# Altium footprint library Transformers.PcbLib: 102 footprints (part 6 of 7)
Each footprint in its own frame and in the unit in brackets; x right, y up, seen from the top. Pads: shape width x height; smd on the part's side, far side on the other; paste and mask are expansions set on the pad; w line width, h text height; cw(c..) or ccw(c..) is an arc to the next point about the centre after c.
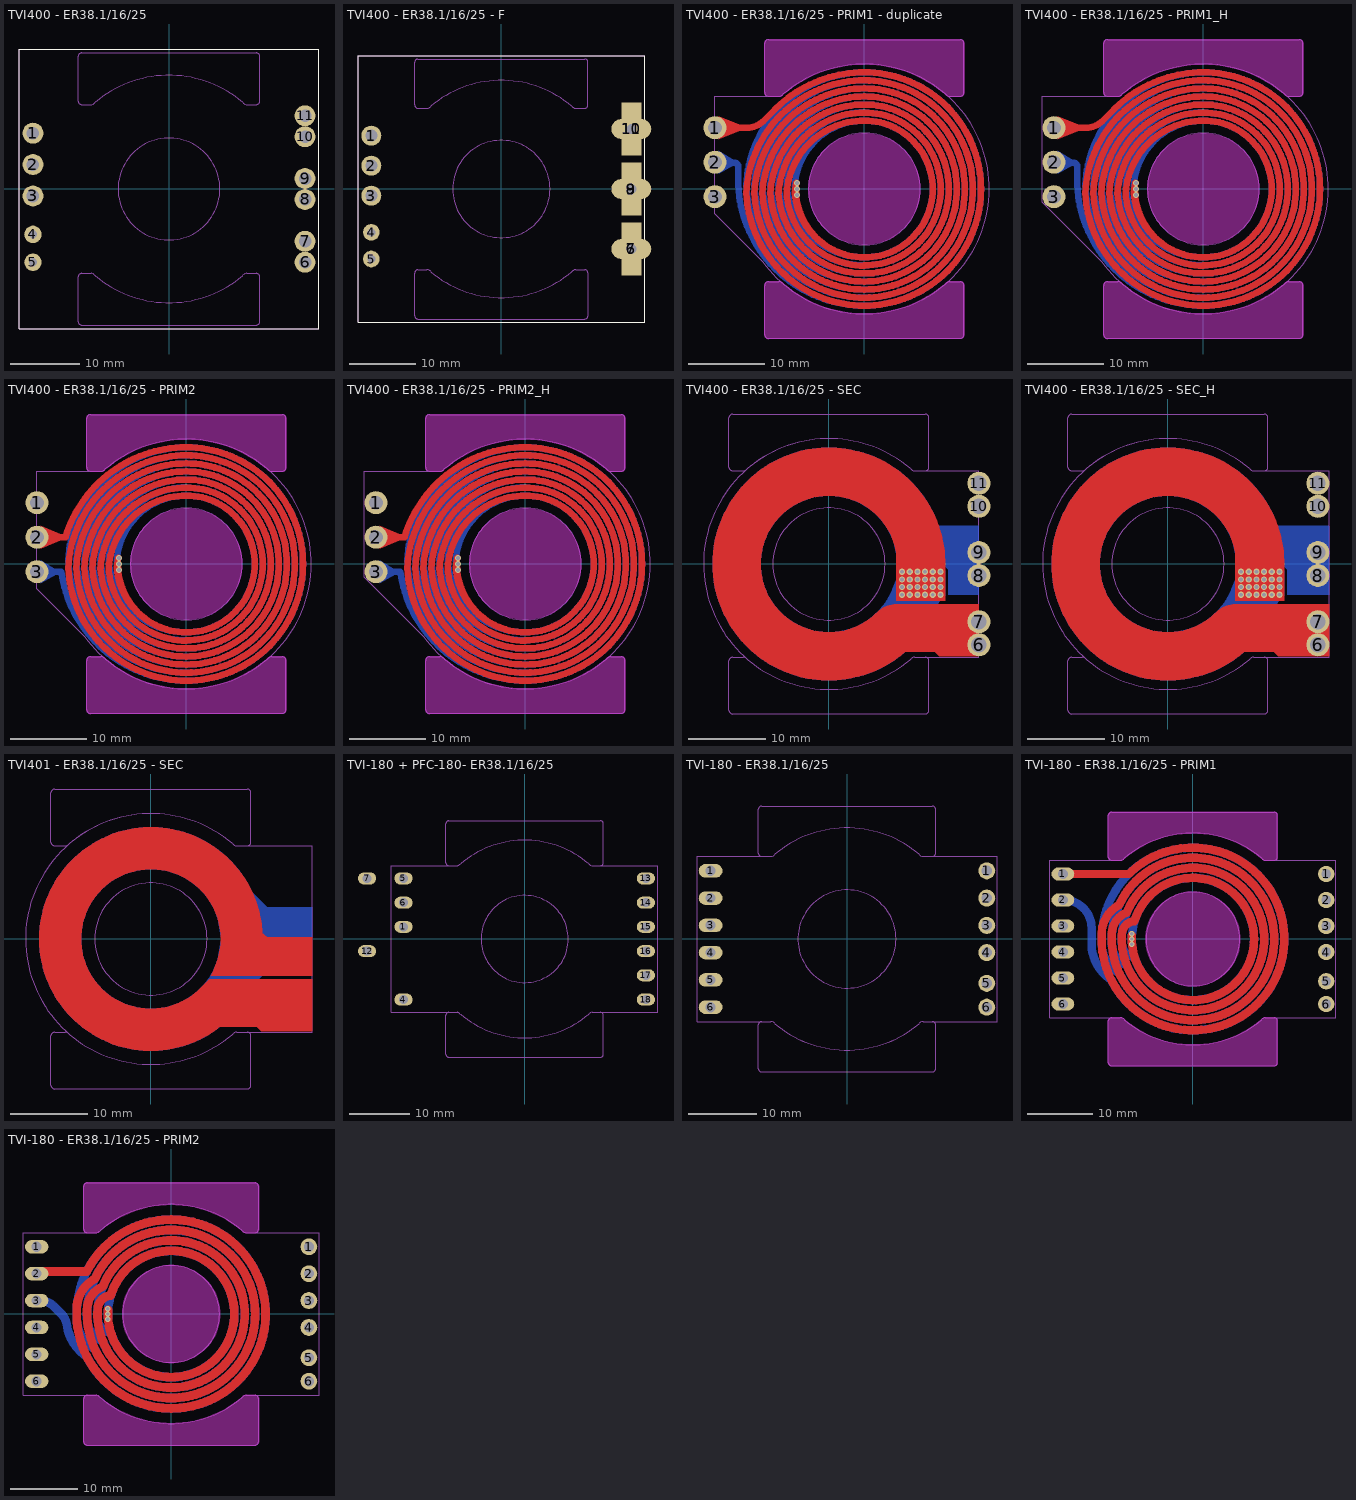
[diagram p5: the footprints below, top view; thin cyan lines are the x and y axes]

## TVI400 - ER38.1/16/25 [mm]
pads (11):
  round 3 hole 1.8: 1(-19.5,8) 2(-19.5,3.5) 3(-19.5,-1) 6(19.5,-10.5) 7(19.5,-7.5) 8(19.5,-1.5) 9(19.5,1.5) 10(19.5,7.5) 11(19.5,10.5)
  round 2.5 hole 1.2: 4(-19.5,-6.5) 5(-19.5,-10.5)
Top Overlay:
  lines w0.15: -21.5,-20 -21.5,20 21.5,20 21.5,-20 -21.5,-20
Top Assembly:
  circle w0.15: c0,0 r7.3
  lines w0.15: -0.251,16.298 cw(c0,0) 10.561,12.416 10.678,12.299 ccw(c11.15,12.771) 11.15,12.103 12.5,12.103 ccw(c12.5,12.603) 13,12.603 13,19 ccw(c12.5,19) 12.5,19.5 -12.5,19.5 ccw(c-12.5,19) -13,19 -13,12.603 ccw(c-12.5,12.603) -12.5,12.103 -11.15,12.103 ccw(c-11.15,12.771) -10.679,12.299 -10.562,12.416 cw(c0,0) 0.251,16.298 ; -13,-19 ccw(c-12.5,-19) -12.5,-19.5 ; -13,-19 ccw(c-12.5,-19) -12.5,-19.5 ; -13,-19 -13,-12.603 ; -13,-19 -13,-12.603 ; -13,-12.603 cw(c-12.5,-12.603) -12.5,-12.103 ; -13,-12.603 cw(c-12.5,-12.603) -12.5,-12.103 ; -12.5,-19.5 12.5,-19.5 ; -12.5,-19.5 12.5,-19.5 ; -12.5,-12.103 -11.15,-12.103 ; -12.5,-12.103 -11.15,-12.103 ; -11.15,-12.103 cw(c-11.15,-12.771) -10.679,-12.299 ; -11.15,-12.103 cw(c-11.15,-12.771) -10.679,-12.299 ; -10.679,-12.299 -10.562,-12.416 ; -10.679,-12.299 -10.562,-12.416 ; -10.561,-12.416 ccw(c0,0) 0.251,-16.298 cw(c0,0) -10.561,-12.416 ; 10.561,-12.416 cw(c0,0) -0.251,-16.298 ccw(c0,0) 10.561,-12.416 ; 10.561,-12.416 10.678,-12.299 ; 10.561,-12.416 10.678,-12.299 ; 10.678,-12.299 cw(c11.15,-12.771) 11.15,-12.103 ; 10.678,-12.299 cw(c11.15,-12.771) 11.15,-12.103 ; 11.15,-12.103 12.5,-12.103 ; 11.15,-12.103 12.5,-12.103 ; 12.5,-19.5 ccw(c12.5,-19) 13,-19 ; 12.5,-19.5 ccw(c12.5,-19) 13,-19 ; 12.5,-12.103 cw(c12.5,-12.603) 13,-12.603 ; 12.5,-12.103 cw(c12.5,-12.603) 13,-12.603 ; 13,-19 13,-12.603 ; 13,-19 13,-12.603 ; -21.5,-20 21.5,-20 21.5,20 -21.5,20 -21.5,-20
3D body "ER38.1-16-25.STEP": height 20, standoff 12, extent -12.7,-19.05 12.7,19.05
3D body "ER38.1-16-25.STEP": height 12, standoff 4, extent -12.7,-19.05 12.7,19.05

## TVI400 - ER38.1/16/25 - F [mm]
pads (11):
  round 3 hole 1.8: 1(-19.5,8) 2(-19.5,3.5) 3(-19.5,-1)
  round 2.5 hole 1.2: 4(-19.5,-6.5) 5(-19.5,-10.5)
  rect 3x8 hole 1.5 square: 6(19.5,-9) 8(19.5,0) 10(19.5,9)
  oval 6x3 all layers, no hole: 7(19.5,-9) 9(19.5,0) 11(19.5,9)
Top Overlay:
  lines w0.15: -21.5,-20 21.5,-20 21.5,20 -21.5,20 -21.5,-20
Top Assembly:
  circle w0.15: c0,0 r7.3
  lines w0.15: -0.251,16.298 cw(c0,0) 10.561,12.416 10.678,12.299 ccw(c11.15,12.771) 11.15,12.103 12.5,12.103 ccw(c12.5,12.603) 13,12.603 13,19 ccw(c12.5,19) 12.5,19.5 -12.5,19.5 ccw(c-12.5,19) -13,19 -13,12.603 ccw(c-12.5,12.603) -12.5,12.103 -11.15,12.103 ccw(c-11.15,12.771) -10.679,12.299 -10.562,12.416 cw(c0,0) 0.251,16.298 ; -13,-19 ccw(c-12.5,-19) -12.5,-19.5 ; -13,-19 ccw(c-12.5,-19) -12.5,-19.5 ; -13,-19 -13,-12.603 ; -13,-19 -13,-12.603 ; -13,-12.603 cw(c-12.5,-12.603) -12.5,-12.103 ; -13,-12.603 cw(c-12.5,-12.603) -12.5,-12.103 ; -12.5,-19.5 12.5,-19.5 ; -12.5,-19.5 12.5,-19.5 ; -12.5,-12.103 -11.15,-12.103 ; -12.5,-12.103 -11.15,-12.103 ; -11.15,-12.103 cw(c-11.15,-12.771) -10.679,-12.299 ; -11.15,-12.103 cw(c-11.15,-12.771) -10.679,-12.299 ; -10.679,-12.299 -10.562,-12.416 ; -10.679,-12.299 -10.562,-12.416 ; -10.561,-12.416 ccw(c0,0) 0.251,-16.298 cw(c0,0) -10.561,-12.416 ; 10.561,-12.416 cw(c0,0) -0.251,-16.298 ccw(c0,0) 10.561,-12.416 ; 10.561,-12.416 10.678,-12.299 ; 10.561,-12.416 10.678,-12.299 ; 10.678,-12.299 cw(c11.15,-12.771) 11.15,-12.103 ; 10.678,-12.299 cw(c11.15,-12.771) 11.15,-12.103 ; 11.15,-12.103 12.5,-12.103 ; 11.15,-12.103 12.5,-12.103 ; 12.5,-19.5 ccw(c12.5,-19) 13,-19 ; 12.5,-19.5 ccw(c12.5,-19) 13,-19 ; 12.5,-12.103 cw(c12.5,-12.603) 13,-12.603 ; 12.5,-12.103 cw(c12.5,-12.603) 13,-12.603 ; 13,-19 13,-12.603 ; 13,-19 13,-12.603 ; -21.5,-20 -21.5,20 21.5,20 21.5,-20 -21.5,-20
3D body "ER38.1-16-25.STEP": height 12, standoff 4, extent -12.7,-19.05 12.7,19.05
3D body "ER38.1-16-25.STEP": height 20, standoff 12, extent -12.7,-19.05 12.7,19.05

## TVI400 - ER38.1/16/25 - PRIM1 - duplicate [mm]
pads (3):
  round 3 hole 1.8: 1(-19.5,8) 2(-19.5,3.5) 3(-19.5,-1)
via -8.8,0.8 diameter 0.8 hole 0.5
via -8.8,-0.8 diameter 0.8 hole 0.5
via -8.8,0 diameter 0.8 hole 0.5
Top Layer:
  region: -19,9.5 -15.25,8 -19,6.5
  lines w0.85: -19,8 -15.307,8 ccw(c-15.307,11.066) -13.139,8.898 -12.019,10.018 cw(c0,-1.25) 0,15.225 ; -10.152,-0.503 ccw(c0,0.175) 0,-10 cw(c0,0.175) -10.153,-0.494 ; -10.148,-0.507 cw(c0,-1.25) 0,8.925 ; -10.147,-0.497 cw(c0,-1.25) 0,8.925 ; -9.085,-0.401 cw(c0,-1.25) -8.892,0.798 ; -9.075,-0.498 ccw(c0,0.175) 0,-8.925 ; -8.911,-0.495 ccw(c0,0) 0,-8.925 ; 0,-15.225 cw(c0,0.2) -15.409,-0.496 ccw(c0,0.2) 0,-15.225 ; 0,-15.225 ccw(c0,0) 15.225,0 ; 0,-15.225 ccw(c0,0) 15.225,0 ; 0,-14.175 cw(c0,0.2) -14.358,-0.505 ccw(c0,0.2) 0,-14.175 ; 0,-14.175 ccw(c0,0) 14.175,0 ; 0,-14.175 ccw(c0,0) 14.175,0 ; 0,-13.125 cw(c0,0.2) -13.306,-0.503 ccw(c0,0.2) 0,-13.125 ; 0,-13.125 ccw(c0,0) 13.125,0 ; 0,-13.125 ccw(c0,0) 13.125,0 ; 0,-12.075 cw(c0,0.2) -12.255,-0.5 ccw(c0,0.2) 0,-12.075 ; 0,-12.075 ccw(c0,0) 12.075,0 ; 0,-12.075 ccw(c0,0) 12.075,0 ; 0,-11.025 cw(c0,0.2) -11.203,-0.497 ccw(c0,0.2) 0,-11.025 ; 0,-11.025 ccw(c0,0) 11.025,0 ; 0,-11.025 ccw(c0,0) 11.025,0 ; 0,-8.925 ccw(c0,0) 8.925,0 ; 0,-8.925 ccw(c0,0) 8.925,0 ; 0,8.925 cw(c0,0) 8.925,0 ; 0,8.925 cw(c0,0) 8.925,0 ; 0,9.975 ccw(c0,-1.25) -11.2,-0.503 cw(c0,-1.25) 0,9.975 ; 0,9.975 cw(c0,0) 9.975,0 ; 0,9.975 cw(c0,0) 9.975,0 ; 0,11.025 ccw(c0,-1.25) -12.252,-0.5 cw(c0,-1.25) 0,11.025 ; 0,11.025 cw(c0,0) 11.025,0 ; 0,11.025 cw(c0,0) 11.025,0 ; 0,12.075 ccw(c0,-1.25) -13.304,-0.497 cw(c0,-1.25) 0,12.075 ; 0,12.075 cw(c0,0) 12.075,0 ; 0,12.075 cw(c0,0) 12.075,0 ; 0,13.125 ccw(c0,-1.25) -14.355,-0.494 cw(c0,-1.25) 0,13.125 ; 0,13.125 cw(c0,0) 13.125,0 ; 0,13.125 cw(c0,0) 13.125,0 ; 0,14.175 ccw(c0,-1.25) -15.407,-0.505 cw(c0,-1.25) 0,14.175 ; 0,14.175 cw(c0,0) 14.175,0 ; 0,14.175 cw(c0,0) 14.175,0 ; 0,15.225 cw(c0,0) 15.225,0 ; 0,15.225 cw(c0,0) 15.225,0 ; 9.975,0 cw(c0,0) 0,-9.975 ccw(c0,0) 9.975,0
Bottom Layer:
  region: -19,5 -16.473,3.441 -19,2
  region: -9.3,0.4
  lines w0.85: -15.409,0.496 cw(c0,-0.2) 0,15.225 cw(c0,0) 15.225,0 cw(c0,0) 0,-15.225 cw(c0,1.25) -16.458,0.505 -16.458,2.899 ccw(c-17,2.899) -17,3.441 -18.941,3.441 ; -15.407,0.505 ccw(c0,1.25) 0,-14.175 ccw(c0,0) 14.175,0 ccw(c0,0) 0,14.175 ccw(c0,-0.2) -14.358,0.505 ; -14.355,0.494 ccw(c0,1.25) 0,-13.125 ccw(c0,0) 13.125,0 ccw(c0,0) 0,13.125 ccw(c0,-0.2) -13.306,0.503 ; -13.304,0.497 ccw(c0,1.25) 0,-12.075 ccw(c0,0) 12.075,0 ccw(c0,0) 0,12.075 ccw(c0,-0.2) -12.255,0.5 ; -12.252,0.5 ccw(c0,1.25) 0,-11.025 ccw(c0,0) 11.025,0 ccw(c0,0) 0,11.025 ccw(c0,-0.2) -11.203,0.497 ; -11.2,0.503 ccw(c0,1.25) 0,-9.975 ccw(c0,0) 9.975,0 ccw(c0,0) 0,9.975 ; -10.152,0.503 cw(c0,-0.175) 0,10 ; -10.147,0.497 ccw(c0,1.25) 0,-8.925 ccw(c0,0) 8.925,0 ccw(c0,0) 0,8.925 ccw(c0,-0.175) -9.075,0.498 ; -9.085,0.401 ccw(c0,1.25) -8.892,-0.798 ; -18.941,3.441 cw(c-18.941,3.5) -19,3.5 ccw(c-18.941,3.5) -18.941,3.441
Keep-Out Layer:
  drawing of 3 lines, arcs and shapes, not listed
Mechanical 2:
  circle w0.15: c0,0 r7.3
  lines w0.15: -19.5,-3 -19.5,-3.238 ; -0.251,-16.298 ccw(c0,0) 10.561,-12.416 ccw(c0,0) -0.251,16.298 ; 0.251,-16.298 cw(c0,0) -13.264,-9.474 -19.5,-3.238 ; 0.251,16.298 ccw(c0,0) -10.562,12.415 -10.679,12.299 cw(c-11.15,12.771) -11.15,12.103 -12.501,12.103 -19.5,12.103 -19.5,-0.5 -19.5,-3.238
Top Assembly:
  circle w0.15: c0,0 r7.3
  lines w0.15: -0.251,16.298 cw(c0,0) 10.561,12.416 10.678,12.299 ccw(c11.15,12.771) 11.15,12.103 12.5,12.103 ccw(c12.5,12.603) 13,12.603 13,19 ccw(c12.5,19) 12.5,19.5 -12.5,19.5 ccw(c-12.5,19) -13,19 -13,12.603 ccw(c-12.5,12.603) -12.5,12.103 -11.15,12.103 ccw(c-11.15,12.771) -10.679,12.299 -10.562,12.416 cw(c0,0) 0.251,16.298 ; -13,-19 ccw(c-12.5,-19) -12.5,-19.5 ; -13,-19 ccw(c-12.5,-19) -12.5,-19.5 ; -13,-19 -13,-12.603 ; -13,-19 -13,-12.603 ; -13,-12.603 cw(c-12.5,-12.603) -12.5,-12.103 ; -13,-12.603 cw(c-12.5,-12.603) -12.5,-12.103 ; -12.5,-19.5 12.5,-19.5 ; -12.5,-19.5 12.5,-19.5 ; -12.5,-12.103 -11.15,-12.103 ; -12.5,-12.103 -11.15,-12.103 ; -11.15,-12.103 cw(c-11.15,-12.771) -10.679,-12.299 ; -11.15,-12.103 cw(c-11.15,-12.771) -10.679,-12.299 ; -10.679,-12.299 -10.562,-12.416 ; -10.679,-12.299 -10.562,-12.416 ; -10.561,-12.416 ccw(c0,0) 0.251,-16.298 cw(c0,0) -10.561,-12.416 ; 10.561,-12.416 cw(c0,0) -0.251,-16.298 ccw(c0,0) 10.561,-12.416 ; 10.561,-12.416 10.678,-12.299 ; 10.561,-12.416 10.678,-12.299 ; 10.678,-12.299 cw(c11.15,-12.771) 11.15,-12.103 ; 10.678,-12.299 cw(c11.15,-12.771) 11.15,-12.103 ; 11.15,-12.103 12.5,-12.103 ; 11.15,-12.103 12.5,-12.103 ; 12.5,-19.5 ccw(c12.5,-19) 13,-19 ; 12.5,-19.5 ccw(c12.5,-19) 13,-19 ; 12.5,-12.103 cw(c12.5,-12.603) 13,-12.603 ; 12.5,-12.103 cw(c12.5,-12.603) 13,-12.603 ; 13,-19 13,-12.603 ; 13,-19 13,-12.603
3D body "ER38.1-16-25.STEP": height 7.5, standoff -0.5, extent -12.7,-19.05 12.7,19.05

## TVI400 - ER38.1/16/25 - PRIM1_H [mm]
pads (3):
  round 3 hole 1.8: 1(-19.5,8) 2(-19.5,3.5) 3(-19.5,-1)
via -8.8,0 diameter 0.8 hole 0.5
via -8.8,-0.8 diameter 0.8 hole 0.5
via -8.8,0.8 diameter 0.8 hole 0.5
Top Layer:
  region: -19,9.5 -15.25,8 -19,6.5
  lines w0.85: -19,8 -15.307,8 ccw(c-15.307,11.066) -13.139,8.898 -12.019,10.018 cw(c0,-1.25) 0,15.225 ; -10.152,-0.503 ccw(c0,0.175) 0,-10 cw(c0,0.175) -10.153,-0.494 ; -10.148,-0.507 cw(c0,-1.25) 0,8.925 ; -10.147,-0.497 cw(c0,-1.25) 0,8.925 ; -9.085,-0.401 cw(c0,-1.25) -8.892,0.798 ; -9.075,-0.498 ccw(c0,0.175) 0,-8.925 ; -8.911,-0.495 ccw(c0,0) 0,-8.925 ; 0,-15.225 ccw(c0,0) 15.225,0 ; 0,-15.225 cw(c0,0.2) -15.409,-0.496 ccw(c0,0.2) 0,-15.225 ; 0,-15.225 ccw(c0,0) 15.225,0 ; 0,-14.175 ccw(c0,0) 14.175,0 ; 0,-14.175 cw(c0,0.2) -14.358,-0.505 ccw(c0,0.2) 0,-14.175 ; 0,-14.175 ccw(c0,0) 14.175,0 ; 0,-13.125 ccw(c0,0) 13.125,0 ; 0,-13.125 cw(c0,0.2) -13.306,-0.503 ccw(c0,0.2) 0,-13.125 ; 0,-13.125 ccw(c0,0) 13.125,0 ; 0,-12.075 ccw(c0,0) 12.075,0 ; 0,-12.075 cw(c0,0.2) -12.255,-0.5 ccw(c0,0.2) 0,-12.075 ; 0,-12.075 ccw(c0,0) 12.075,0 ; 0,-11.025 ccw(c0,0) 11.025,0 ; 0,-11.025 cw(c0,0.2) -11.203,-0.497 ccw(c0,0.2) 0,-11.025 ; 0,-11.025 ccw(c0,0) 11.025,0 ; 0,-8.925 ccw(c0,0) 8.925,0 ; 0,-8.925 ccw(c0,0) 8.925,0 ; 0,8.925 cw(c0,0) 8.925,0 ; 0,8.925 cw(c0,0) 8.925,0 ; 0,9.975 cw(c0,0) 9.975,0 ; 0,9.975 ccw(c0,-1.25) -11.2,-0.503 cw(c0,-1.25) 0,9.975 ; 0,9.975 cw(c0,0) 9.975,0 ; 0,11.025 cw(c0,0) 11.025,0 ; 0,11.025 ccw(c0,-1.25) -12.252,-0.5 cw(c0,-1.25) 0,11.025 ; 0,11.025 cw(c0,0) 11.025,0 ; 0,12.075 cw(c0,0) 12.075,0 ; 0,12.075 ccw(c0,-1.25) -13.304,-0.497 cw(c0,-1.25) 0,12.075 ; 0,12.075 cw(c0,0) 12.075,0 ; 0,13.125 cw(c0,0) 13.125,0 ; 0,13.125 ccw(c0,-1.25) -14.355,-0.494 cw(c0,-1.25) 0,13.125 ; 0,13.125 cw(c0,0) 13.125,0 ; 0,14.175 cw(c0,0) 14.175,0 ; 0,14.175 ccw(c0,-1.25) -15.407,-0.505 cw(c0,-1.25) 0,14.175 ; 0,14.175 cw(c0,0) 14.175,0 ; 0,15.225 cw(c0,0) 15.225,0 ; 0,15.225 cw(c0,0) 15.225,0 ; 9.975,0 cw(c0,0) 0,-9.975 ccw(c0,0) 9.975,0
Bottom Layer:
  region: -9.3,0.4
  region: -19,5 -16.473,3.441 -19,2
  lines w0.85: -15.409,0.496 cw(c0,-0.2) 0,15.225 cw(c0,0) 15.225,0 cw(c0,0) 0,-15.225 cw(c0,1.25) -16.458,0.505 -16.458,2.899 ccw(c-17,2.899) -17,3.441 -18.941,3.441 ; -15.407,0.505 ccw(c0,1.25) 0,-14.175 ccw(c0,0) 14.175,0 ccw(c0,0) 0,14.175 ccw(c0,-0.2) -14.358,0.505 ; -14.355,0.494 ccw(c0,1.25) 0,-13.125 ccw(c0,0) 13.125,0 ccw(c0,0) 0,13.125 ccw(c0,-0.2) -13.306,0.503 ; -13.304,0.497 ccw(c0,1.25) 0,-12.075 ccw(c0,0) 12.075,0 ccw(c0,0) 0,12.075 ccw(c0,-0.2) -12.255,0.5 ; -12.252,0.5 ccw(c0,1.25) 0,-11.025 ccw(c0,0) 11.025,0 ccw(c0,0) 0,11.025 ccw(c0,-0.2) -11.203,0.497 ; -11.2,0.503 ccw(c0,1.25) 0,-9.975 ccw(c0,0) 9.975,0 ccw(c0,0) 0,9.975 ; -10.152,0.503 cw(c0,-0.175) 0,10 ; -10.147,0.497 ccw(c0,1.25) 0,-8.925 ccw(c0,0) 8.925,0 ccw(c0,0) 0,8.925 ccw(c0,-0.175) -9.075,0.498 ; -9.085,0.401 ccw(c0,1.25) -8.892,-0.798 ; -18.941,3.441 cw(c-18.941,3.5) -19,3.5 ccw(c-18.941,3.5) -18.941,3.441
Keep-Out Layer:
  drawing of 3 lines, arcs and shapes, not listed
Mechanical 2:
  circle w0.15: c0,0 r7.3
  lines w0.15: -0.251,-16.298 ccw(c0,0) 10.561,-12.416 ccw(c0,0) -0.251,16.298 ; 0.251,-16.298 cw(c0,0) -13.264,-9.474 -19.5,-3.238 -21,-1.738 -21,1 -21,12.103 -12.501,12.103 -11.15,12.103 ccw(c-11.15,12.771) -10.679,12.299 -10.562,12.416 cw(c0,0) 0.251,16.298
Top Assembly:
  circle w0.15: c0,0 r7.3
  lines w0.15: -0.251,16.298 cw(c0,0) 10.561,12.416 10.678,12.299 ccw(c11.15,12.771) 11.15,12.103 12.5,12.103 ccw(c12.5,12.603) 13,12.603 13,19 ccw(c12.5,19) 12.5,19.5 -12.5,19.5 ccw(c-12.5,19) -13,19 -13,12.603 ccw(c-12.5,12.603) -12.5,12.103 -11.15,12.103 ccw(c-11.15,12.771) -10.679,12.299 -10.562,12.416 cw(c0,0) 0.251,16.298 ; -13,-19 ccw(c-12.5,-19) -12.5,-19.5 ; -13,-19 ccw(c-12.5,-19) -12.5,-19.5 ; -13,-19 -13,-12.603 ; -13,-19 -13,-12.603 ; -13,-12.603 cw(c-12.5,-12.603) -12.5,-12.103 ; -13,-12.603 cw(c-12.5,-12.603) -12.5,-12.103 ; -12.5,-19.5 12.5,-19.5 ; -12.5,-19.5 12.5,-19.5 ; -12.5,-12.103 -11.15,-12.103 ; -12.5,-12.103 -11.15,-12.103 ; -11.15,-12.103 cw(c-11.15,-12.771) -10.679,-12.299 ; -11.15,-12.103 cw(c-11.15,-12.771) -10.679,-12.299 ; -10.679,-12.299 -10.562,-12.416 ; -10.679,-12.299 -10.562,-12.416 ; -10.561,-12.416 ccw(c0,0) 0.251,-16.298 cw(c0,0) -10.561,-12.416 ; 10.561,-12.416 cw(c0,0) -0.251,-16.298 ccw(c0,0) 10.561,-12.416 ; 10.561,-12.416 10.678,-12.299 ; 10.561,-12.416 10.678,-12.299 ; 10.678,-12.299 cw(c11.15,-12.771) 11.15,-12.103 ; 10.678,-12.299 cw(c11.15,-12.771) 11.15,-12.103 ; 11.15,-12.103 12.5,-12.103 ; 11.15,-12.103 12.5,-12.103 ; 12.5,-19.5 ccw(c12.5,-19) 13,-19 ; 12.5,-19.5 ccw(c12.5,-19) 13,-19 ; 12.5,-12.103 cw(c12.5,-12.603) 13,-12.603 ; 12.5,-12.103 cw(c12.5,-12.603) 13,-12.603 ; 13,-19 13,-12.603 ; 13,-19 13,-12.603
3D body "ER38.1-16-25.STEP": height 7.5, standoff -0.5, extent -12.7,-19.05 12.7,19.05

## TVI400 - ER38.1/16/25 - PRIM2 [mm]
pads (3):
  round 3 hole 1.8: 1(-19.5,8) 2(-19.5,3.5) 3(-19.5,-1)
via -8.8,0 diameter 0.8 hole 0.5
via -8.8,-0.8 diameter 0.8 hole 0.5
via -8.8,0.8 diameter 0.8 hole 0.5
Top Layer:
  region: -19,5 -15.5,3.5 -19,2
  lines w0.85: -19.5,3.5 -15.789,3.5 -15.769,3.52 cw(c0,-1.25) 0,15.225 ; -10.152,-0.503 ccw(c0,0.175) 0,-10 cw(c0,0.175) -10.153,-0.494 ; -10.148,-0.507 cw(c0,-1.25) 0,8.925 ; -10.147,-0.497 cw(c0,-1.25) 0,8.925 ; -9.085,-0.401 cw(c0,-1.25) -8.892,0.798 ; -9.075,-0.498 ccw(c0,0.175) 0,-8.925 ; -8.911,-0.495 ccw(c0,0) 0,-8.925 ; 0,-15.225 ccw(c0,0) 15.225,0 ; 0,-15.225 cw(c0,0.2) -15.409,-0.496 ccw(c0,0.2) 0,-15.225 ; 0,-15.225 ccw(c0,0) 15.225,0 ; 0,-14.175 ccw(c0,0) 14.175,0 ; 0,-14.175 cw(c0,0.2) -14.358,-0.505 ccw(c0,0.2) 0,-14.175 ; 0,-14.175 ccw(c0,0) 14.175,0 ; 0,-13.125 ccw(c0,0) 13.125,0 ; 0,-13.125 cw(c0,0.2) -13.306,-0.503 ccw(c0,0.2) 0,-13.125 ; 0,-13.125 ccw(c0,0) 13.125,0 ; 0,-12.075 ccw(c0,0) 12.075,0 ; 0,-12.075 cw(c0,0.2) -12.255,-0.5 ccw(c0,0.2) 0,-12.075 ; 0,-12.075 ccw(c0,0) 12.075,0 ; 0,-11.025 ccw(c0,0) 11.025,0 ; 0,-11.025 cw(c0,0.2) -11.203,-0.497 ccw(c0,0.2) 0,-11.025 ; 0,-11.025 ccw(c0,0) 11.025,0 ; 0,-8.925 ccw(c0,0) 8.925,0 ; 0,-8.925 ccw(c0,0) 8.925,0 ; 0,8.925 cw(c0,0) 8.925,0 ; 0,8.925 cw(c0,0) 8.925,0 ; 0,9.975 cw(c0,0) 9.975,0 ; 0,9.975 ccw(c0,-1.25) -11.2,-0.503 cw(c0,-1.25) 0,9.975 ; 0,9.975 cw(c0,0) 9.975,0 ; 0,11.025 cw(c0,0) 11.025,0 ; 0,11.025 ccw(c0,-1.25) -12.252,-0.5 cw(c0,-1.25) 0,11.025 ; 0,11.025 cw(c0,0) 11.025,0 ; 0,12.075 cw(c0,0) 12.075,0 ; 0,12.075 ccw(c0,-1.25) -13.304,-0.497 cw(c0,-1.25) 0,12.075 ; 0,12.075 cw(c0,0) 12.075,0 ; 0,13.125 cw(c0,0) 13.125,0 ; 0,13.125 ccw(c0,-1.25) -14.355,-0.494 cw(c0,-1.25) 0,13.125 ; 0,13.125 cw(c0,0) 13.125,0 ; 0,14.175 cw(c0,0) 14.175,0 ; 0,14.175 ccw(c0,-1.25) -15.407,-0.505 cw(c0,-1.25) 0,14.175 ; 0,14.175 cw(c0,0) 14.175,0 ; 0,15.225 cw(c0,0) 15.225,0 ; 0,15.225 cw(c0,0) 15.225,0 ; 9.975,0 cw(c0,0) 0,-9.975 ccw(c0,0) 9.975,0
Bottom Layer:
  region: -19,0.5 -16.473,-1.059 -19,-2.5
  region: -9.3,0.4
  lines w0.85: -19.5,-1 -16.32,-1 ; -16.32,-1.001 ccw(c0,1.25) 0,-15.225 ccw(c0,0) 15.225,0 ccw(c0,0) 0,15.225 ccw(c0,-0.2) -15.409,0.496 ; -15.407,0.505 ccw(c0,1.25) 0,-14.175 ccw(c0,0) 14.175,0 ccw(c0,0) 0,14.175 ccw(c0,-0.2) -14.358,0.505 ; -14.355,0.494 ccw(c0,1.25) 0,-13.125 ccw(c0,0) 13.125,0 ccw(c0,0) 0,13.125 ccw(c0,-0.2) -13.306,0.503 ; -13.304,0.497 ccw(c0,1.25) 0,-12.075 ccw(c0,0) 12.075,0 ccw(c0,0) 0,12.075 ccw(c0,-0.2) -12.255,0.5 ; -12.252,0.5 ccw(c0,1.25) 0,-11.025 ccw(c0,0) 11.025,0 ccw(c0,0) 0,11.025 ccw(c0,-0.2) -11.203,0.497 ; -11.2,0.503 ccw(c0,1.25) 0,-9.975 ccw(c0,0) 9.975,0 ccw(c0,0) 0,9.975 ; -10.152,0.503 cw(c0,-0.175) 0,10 ; -10.147,0.497 ccw(c0,1.25) 0,-8.925 ccw(c0,0) 8.925,0 ccw(c0,0) 0,8.925 ccw(c0,-0.175) -9.075,0.498 ; -9.085,0.401 ccw(c0,1.25) -8.892,-0.798 ; -19,3.5 ccw(c-18.941,3.5) -18.941,3.441 cw(c-18.941,3.5) -19,3.5
Keep-Out Layer:
  drawing of 3 lines, arcs and shapes, not listed
Mechanical 2:
  circle w0.15: c0,0 r7.3
  lines w0.15: -19.5,-3 -19.5,-3.238 ; -0.251,-16.298 ccw(c0,0) 10.561,-12.416 ccw(c0,0) -0.251,16.298 ; 0.251,-16.298 cw(c0,0) -13.264,-9.474 -19.5,-3.238 ; 0.251,16.298 ccw(c0,0) -10.562,12.415 -10.679,12.299 cw(c-11.15,12.771) -11.15,12.103 -12.501,12.103 -19.5,12.103 -19.5,-0.5 -19.5,-3.238
Top Assembly:
  circle w0.15: c0,0 r7.3
  lines w0.15: -0.251,16.298 cw(c0,0) 10.561,12.416 10.678,12.299 ccw(c11.15,12.771) 11.15,12.103 12.5,12.103 ccw(c12.5,12.603) 13,12.603 13,19 ccw(c12.5,19) 12.5,19.5 -12.5,19.5 ccw(c-12.5,19) -13,19 -13,12.603 ccw(c-12.5,12.603) -12.5,12.103 -11.15,12.103 ccw(c-11.15,12.771) -10.679,12.299 -10.562,12.416 cw(c0,0) 0.251,16.298 ; -13,-19 ccw(c-12.5,-19) -12.5,-19.5 ; -13,-19 ccw(c-12.5,-19) -12.5,-19.5 ; -13,-19 -13,-12.603 ; -13,-19 -13,-12.603 ; -13,-12.603 cw(c-12.5,-12.603) -12.5,-12.103 ; -13,-12.603 cw(c-12.5,-12.603) -12.5,-12.103 ; -12.5,-19.5 12.5,-19.5 ; -12.5,-19.5 12.5,-19.5 ; -12.5,-12.103 -11.15,-12.103 ; -12.5,-12.103 -11.15,-12.103 ; -11.15,-12.103 cw(c-11.15,-12.771) -10.679,-12.299 ; -11.15,-12.103 cw(c-11.15,-12.771) -10.679,-12.299 ; -10.679,-12.299 -10.562,-12.416 ; -10.679,-12.299 -10.562,-12.416 ; -10.561,-12.416 ccw(c0,0) 0.251,-16.298 cw(c0,0) -10.561,-12.416 ; 10.561,-12.416 cw(c0,0) -0.251,-16.298 ccw(c0,0) 10.561,-12.416 ; 10.561,-12.416 10.678,-12.299 ; 10.561,-12.416 10.678,-12.299 ; 10.678,-12.299 cw(c11.15,-12.771) 11.15,-12.103 ; 10.678,-12.299 cw(c11.15,-12.771) 11.15,-12.103 ; 11.15,-12.103 12.5,-12.103 ; 11.15,-12.103 12.5,-12.103 ; 12.5,-19.5 ccw(c12.5,-19) 13,-19 ; 12.5,-19.5 ccw(c12.5,-19) 13,-19 ; 12.5,-12.103 cw(c12.5,-12.603) 13,-12.603 ; 12.5,-12.103 cw(c12.5,-12.603) 13,-12.603 ; 13,-19 13,-12.603 ; 13,-19 13,-12.603
3D body "ER38.1-16-25.STEP": height 7.5, standoff -0.5, extent -12.7,-19.05 12.7,19.05

## TVI400 - ER38.1/16/25 - PRIM2_H [mm]
pads (3):
  round 3 hole 1.8: 1(-19.5,8) 2(-19.5,3.5) 3(-19.5,-1)
via -8.8,0 diameter 0.8 hole 0.5
via -8.8,-0.8 diameter 0.8 hole 0.5
via -8.8,0.8 diameter 0.8 hole 0.5
Top Layer:
  region: -19,5 -15.5,3.5 -19,2
  lines w0.85: -19.5,3.5 -15.789,3.5 -15.769,3.52 cw(c0,-1.25) 0,15.225 ; -10.152,-0.503 ccw(c0,0.175) 0,-10 cw(c0,0.175) -10.153,-0.494 ; -10.148,-0.507 cw(c0,-1.25) 0,8.925 ; -10.147,-0.497 cw(c0,-1.25) 0,8.925 ; -9.085,-0.401 cw(c0,-1.25) -8.892,0.798 ; -9.075,-0.498 ccw(c0,0.175) 0,-8.925 ; -8.911,-0.495 ccw(c0,0) 0,-8.925 ; 0,-15.225 ccw(c0,0) 15.225,0 ; 0,-15.225 cw(c0,0.2) -15.409,-0.496 ccw(c0,0.2) 0,-15.225 ; 0,-15.225 ccw(c0,0) 15.225,0 ; 0,-14.175 ccw(c0,0) 14.175,0 ; 0,-14.175 cw(c0,0.2) -14.358,-0.505 ccw(c0,0.2) 0,-14.175 ; 0,-14.175 ccw(c0,0) 14.175,0 ; 0,-13.125 ccw(c0,0) 13.125,0 ; 0,-13.125 cw(c0,0.2) -13.306,-0.503 ccw(c0,0.2) 0,-13.125 ; 0,-13.125 ccw(c0,0) 13.125,0 ; 0,-12.075 ccw(c0,0) 12.075,0 ; 0,-12.075 cw(c0,0.2) -12.255,-0.5 ccw(c0,0.2) 0,-12.075 ; 0,-12.075 ccw(c0,0) 12.075,0 ; 0,-11.025 ccw(c0,0) 11.025,0 ; 0,-11.025 cw(c0,0.2) -11.203,-0.497 ccw(c0,0.2) 0,-11.025 ; 0,-11.025 ccw(c0,0) 11.025,0 ; 0,-8.925 ccw(c0,0) 8.925,0 ; 0,-8.925 ccw(c0,0) 8.925,0 ; 0,8.925 cw(c0,0) 8.925,0 ; 0,8.925 cw(c0,0) 8.925,0 ; 0,9.975 cw(c0,0) 9.975,0 ; 0,9.975 ccw(c0,-1.25) -11.2,-0.503 cw(c0,-1.25) 0,9.975 ; 0,9.975 cw(c0,0) 9.975,0 ; 0,11.025 cw(c0,0) 11.025,0 ; 0,11.025 ccw(c0,-1.25) -12.252,-0.5 cw(c0,-1.25) 0,11.025 ; 0,11.025 cw(c0,0) 11.025,0 ; 0,12.075 cw(c0,0) 12.075,0 ; 0,12.075 ccw(c0,-1.25) -13.304,-0.497 cw(c0,-1.25) 0,12.075 ; 0,12.075 cw(c0,0) 12.075,0 ; 0,13.125 cw(c0,0) 13.125,0 ; 0,13.125 ccw(c0,-1.25) -14.355,-0.494 cw(c0,-1.25) 0,13.125 ; 0,13.125 cw(c0,0) 13.125,0 ; 0,14.175 cw(c0,0) 14.175,0 ; 0,14.175 ccw(c0,-1.25) -15.407,-0.505 cw(c0,-1.25) 0,14.175 ; 0,14.175 cw(c0,0) 14.175,0 ; 0,15.225 cw(c0,0) 15.225,0 ; 0,15.225 cw(c0,0) 15.225,0 ; 9.975,0 cw(c0,0) 0,-9.975 ccw(c0,0) 9.975,0
Bottom Layer:
  region: -19,0.5 -16.473,-1.059 -19,-2.5
  region: -9.3,0.4
  lines w0.85: -19.5,-1 -16.32,-1 ; -16.32,-1.001 ccw(c0,1.25) 0,-15.225 ccw(c0,0) 15.225,0 ccw(c0,0) 0,15.225 ccw(c0,-0.2) -15.409,0.496 ; -15.407,0.505 ccw(c0,1.25) 0,-14.175 ccw(c0,0) 14.175,0 ccw(c0,0) 0,14.175 ccw(c0,-0.2) -14.358,0.505 ; -14.355,0.494 ccw(c0,1.25) 0,-13.125 ccw(c0,0) 13.125,0 ccw(c0,0) 0,13.125 ccw(c0,-0.2) -13.306,0.503 ; -13.304,0.497 ccw(c0,1.25) 0,-12.075 ccw(c0,0) 12.075,0 ccw(c0,0) 0,12.075 ccw(c0,-0.2) -12.255,0.5 ; -12.252,0.5 ccw(c0,1.25) 0,-11.025 ccw(c0,0) 11.025,0 ccw(c0,0) 0,11.025 ccw(c0,-0.2) -11.203,0.497 ; -11.2,0.503 ccw(c0,1.25) 0,-9.975 ccw(c0,0) 9.975,0 ccw(c0,0) 0,9.975 ; -10.152,0.503 cw(c0,-0.175) 0,10 ; -10.147,0.497 ccw(c0,1.25) 0,-8.925 ccw(c0,0) 8.925,0 ccw(c0,0) 0,8.925 ccw(c0,-0.175) -9.075,0.498 ; -9.085,0.401 ccw(c0,1.25) -8.892,-0.798 ; -19,3.5 ccw(c-18.941,3.5) -18.941,3.441 cw(c-18.941,3.5) -19,3.5
Keep-Out Layer:
  drawing of 3 lines, arcs and shapes, not listed
Mechanical 2:
  circle w0.15: c0,0 r7.3
  lines w0.15: -0.251,-16.298 ccw(c0,0) 10.561,-12.416 ccw(c0,0) -0.251,16.298 ; 0.251,-16.298 cw(c0,0) -13.264,-9.474 -19.5,-3.238 -21,-1.738 -21,1 -21,12.103 -12.501,12.103 -11.15,12.103 ccw(c-11.15,12.771) -10.679,12.299 -10.562,12.416 cw(c0,0) 0.251,16.298